# Altium footprint library 二极管-整流桥.PcbLib: 42 footprints (part 2 of 3)
Each footprint in its own frame and in the unit in brackets; x right, y up, seen from the top. Pads: shape width x height; smd on the part's side, far side on the other; paste and mask are expansions set on the pad; w line width, h text height; cw(c..) or ccw(c..) is an arc to the next point about the centre after c.
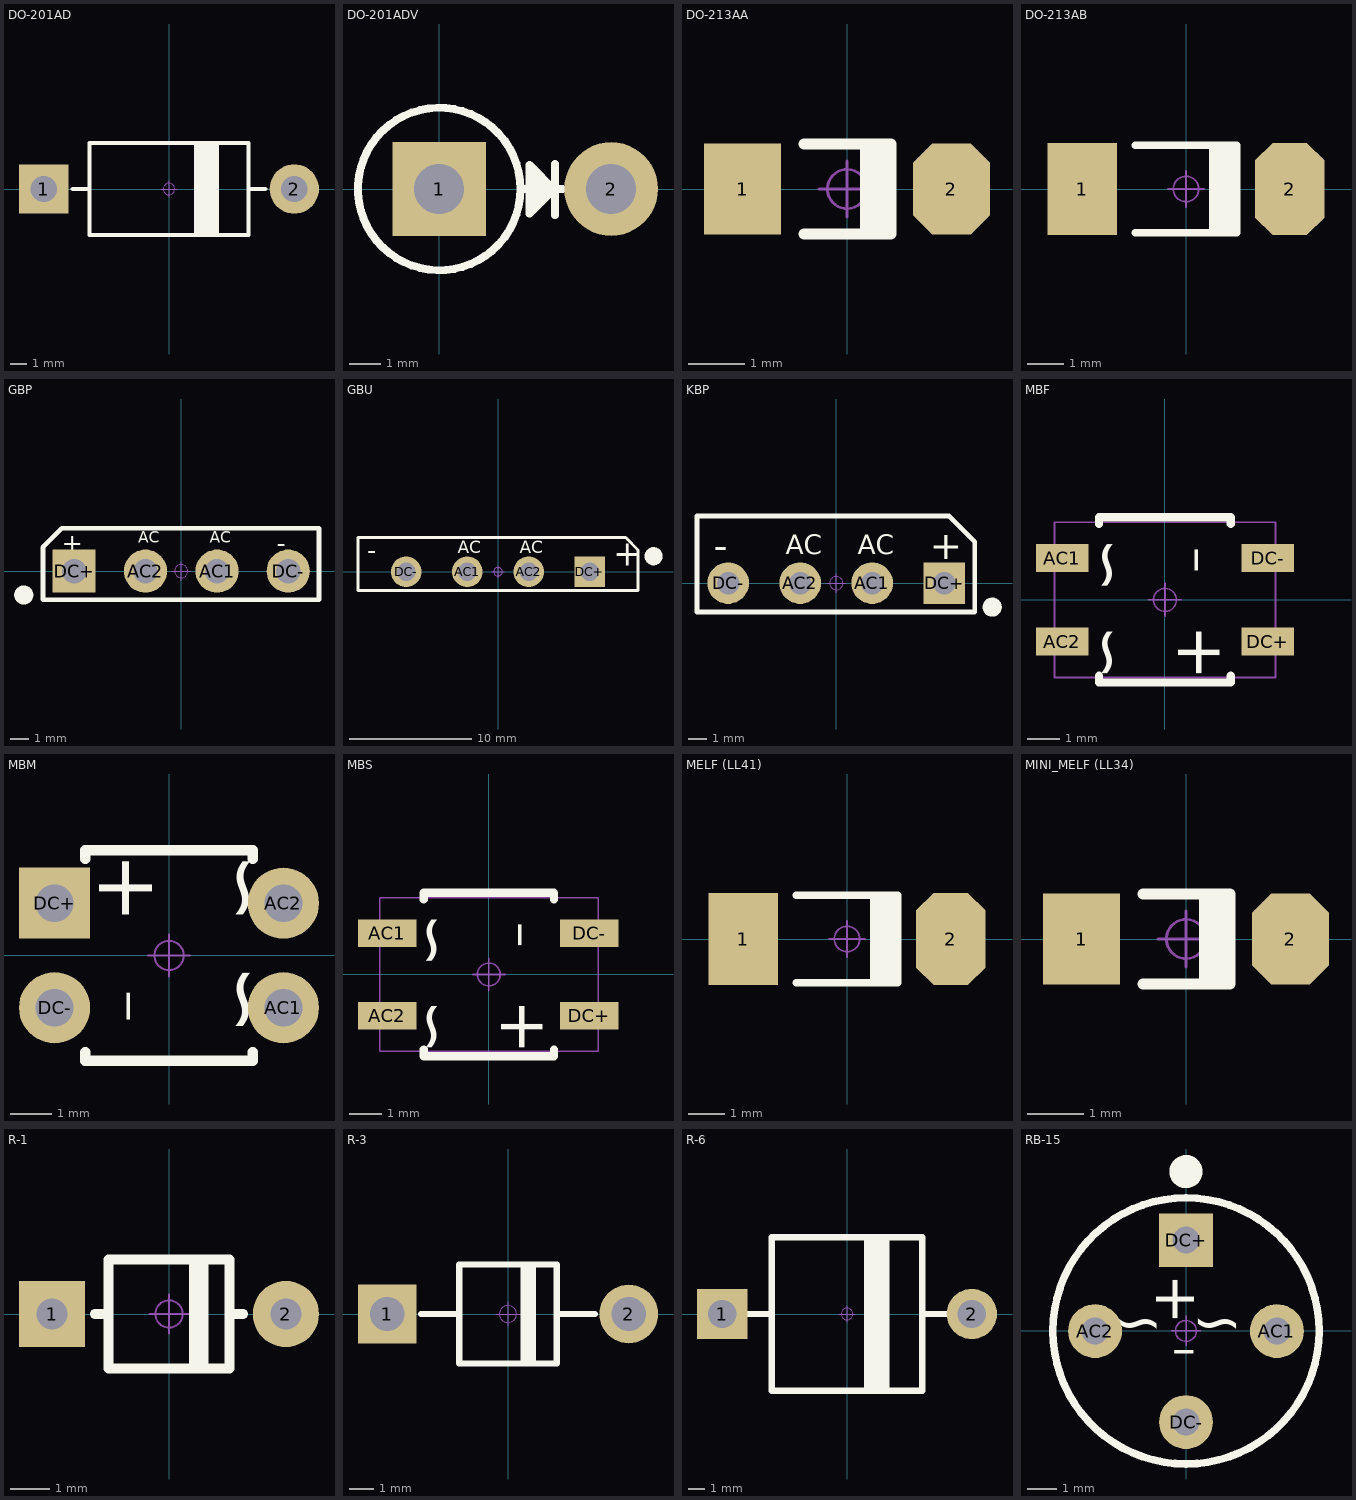
[diagram p1: the footprints below, top view; thin cyan lines are the x and y axes]

## DO-201AD [mm] "5.2*15.2mm(直径，脚距）"
pads (2):
  rect 3x3 hole 1.6: 1(-7.6,0)
  round 3 hole 1.6: 2(7.6,0)
Top Overlay:
  rectangle: 1.524,-2.794 3.048,2.794
  lines w0.254: -5.842,0 -4.826,0 ; 4.826,0 5.842,0 ; -4.826,-2.794 4.826,-2.794 4.826,2.794 -4.826,2.794 -4.826,-2.794
Mechanical 15:
  circle w0.05: c0,0 r0.35
  lines w0.05: -0.5,0 0.5,0 ; 0,-0.5 0,0.5
3D body: height 5.25, standoff -3.46, extent -8.25,-2.601 8.25,2.601

## DO-201ADV [mm] "5.2*5.5mm(直径，脚距）"
pads (2):
  rect 3x3 hole 1.6: 1(0,0)
  round 3 hole 1.6: 2(5.5,0)
Top Overlay:
  circle w0.254: c0,0 r2.6
  lines w0.254: 2.616,0 3.698,0 ; 3.048,0.559 3.073,-0.432 3.556,0 ; 3.302,-0.254 3.302,0 3.302,0.254 3.556,0 ; 3.658,-0.02 2.885,-0.792 2.885,0.775 3.698,-0.038 ; 3.698,-0.841 3.698,0.805 ; 3.937,0 3.556,0
3D body: height 12, standoff -3.46, extent -2.601,-2.601 6.15,2.601

## DO-213AA [mm] "1.5*3.5mm(直径，脚距）"
pads (2):
  rect 1.37x1.62 smd: 1(-1.855,0)
  oct 1.37x1.62 smd: 2(1.855,0)
Top Overlay:
  rectangle: 0.227,-0.8 0.777,0.8
  lines w0.2: -0.762,-0.8 0.777,-0.8 0.777,0.8 -0.762,0.8
Mechanical 15:
  circle w0.05: c0,0 r0.35
  lines w0.05: -0.5,0 0.5,0 ; 0,-0.5 0,0.5
3D body: height 1.53, standoff 0.03, extent -1.75,-0.751 1.75,0.751

## DO-213AB [mm] "2.5*5.6mm(直径，脚距）"
height 2.54
pads (2):
  rect 1.9x2.54 smd: 1(-2.85,0)
  oct 1.9x2.54 smd: 2(2.85,0)
Top Overlay:
  rectangle: 0.85,-1.2 1.4,1.2
  rectangle: 0.635,-1.2 0.85,1.2
  lines w0.2: -1.4,-1.2 1.4,-1.2 1.4,1.2 -1.4,1.2
Mechanical 15:
  circle w0.05: c0,0 r0.35
  lines w0.05: -0.5,0 0.5,0 ; 0,-0.5 0,0.5
3D body: height 2.55, standoff 0.05, extent -2.53,-1.251 2.53,1.251

## GBP [mm] "14.2*2.9*10.5mm(长宽高)"
pads (4):
  round 2.3 hole 1.3: AC1(1.91,0) AC2(-1.9,0) DC-(5.7,0)
  rect 2.3x2.3 hole 1.3: DC+(-5.7,0)
Top Overlay:
  circle w0.508: c-8.382,-1.27 r0.254
  lines w0.254: -7.36,-1.524 -7.36,1.276 -6.35,2.286 7.34,2.286 7.34,-1.524 -7.36,-1.524
  text "AC" at 1.524,1.524 h0.6
  text "+" at -6.35,1.016 h1
  text "-" at 5.08,1.016 h1
  text "AC" at -2.286,1.524 h0.6
Mechanical 15:
  circle w0.05: c0,0 r0.35
  lines w0.05: -0.5,0 0.5,0 ; 0,-0.5 0,0.5
3D body: height 12.8, standoff -3.6, extent -7.1,-1 7.1,1.9

## GBU [mm] "整流桥，脚距：5mm/200mil"
pads (4):
  round 2.5 hole 1.5: AC1(-2.5,0) AC2(2.5,0) DC-(-7.5,0)
  rect 2.5x2.5 hole 1.5: DC+(7.5,0)
Top Overlay:
  circle w0.762: c12.7,1.27 r0.359
  lines w0.254: -11.43,-1.524 -11.43,2.794 -8.422,2.794 10.414,2.794 11.43,1.778 11.43,-1.524 -11.43,-1.524
  text "-" at -10.668,1.016 h1.52
  text "+" at 9.398,0.508 h2.03
  text "AC" at -3.302,1.524 h1.02
  text "AC" at 1.778,1.524 h1.02
Mechanical 15:
  circle w0.05: c0,0 r0.35
  lines w0.05: -0.5,0 0.5,0 ; 0,-0.5 0,0.5
3D body: height 20.8, standoff -4, extent -11,-1.15 11,2.35

## KBP [mm] "14.7*4.8*12.2mm(长宽高)"
pads (4):
  round 2.2 hole 1.2: AC1(1.9,0) AC2(-1.91,0) DC-(-5.72,0)
  rect 2.2x2.2 hole 1.2: DC+(5.71,0)
Top Overlay:
  circle w0.508: c8.25,-1.27 r0.254
  lines w0.254: -7.37,-1.524 -7.37,3.55 5.97,3.55 7.33,2.19 7.33,-1.524 -7.37,-1.524
  text "+" at 4.948,1.27 h1.5
  text "-" at -6.482,1.27 h1.5
  text "AC" at -2.672,1.524 h1.02
  text "AC" at 1.138,1.524 h1.02
Mechanical 15:
  circle w0.05: c0,0 r0.35
  lines w0.05: -0.5,0 0.5,0 ; 0,-0.5 0,0.5
3D body: height 11.7, standoff -3.1, extent -7.35,-1.25 7.35,3.55

## MBF [mm] "4.7*7*1.5mm(长宽高)"
height 12.3
pads (4):
  rect 1.6x0.85 smd: AC1(-3.127,1.27) AC2(-3.127,-1.27) DC+(3.127,-1.27) DC-(3.127,1.27)
Top Overlay:
  lines w0.254: -2.007,-2.311 -2.007,-2.515 2.007,-2.515 2.007,-2.311 ; -2.007,2.311 -2.007,2.515 2.007,2.515 2.007,2.311
  text "~" at -0.635,1.905 h2.54
  text "~" at -0.635,-0.762 h2.54
  text "-" at 2.159,1.651 h3.05
  text "+" at 2.159,-0.762 h2.54
Mechanical 13:
  lines w0.05: -3.363,-2.363 3.363,-2.363 3.363,2.362 -3.363,2.362 -3.363,-2.363
Mechanical 15:
  circle w0.05: c0,0 r0.35
  lines w0.05: -0.5,0 0.5,0 ; 0,-0.5 0,0.5
3D body: height 1.6, standoff -0.03, extent -3.5,-2.35 3.5,2.35

## MBM [mm] "4.8*5.2*2.5mm(长宽高)"
pads (4):
  round 1.7 hole 0.9: AC1(2.737,-1.25) AC2(2.737,1.25) DC-(-2.737,-1.25)
  rect 1.7x1.7 hole 0.9: DC+(-2.737,1.25)
Top Overlay:
  lines w0.254: -2.007,-2.311 -2.007,-2.515 2.007,-2.515 2.007,-2.311 ; -2.007,2.311 -2.007,2.515 2.007,2.515 2.007,2.311
  text "+" at -2.159,0.762 h2.54
  text "-" at -2.159,-1.651 h3.05
  text "~" at 0.635,0.762 h2.54
  text "~" at 0.635,-1.905 h2.54
Mechanical 15:
  circle w0.05: c0,0 r0.35
  lines w0.05: -0.5,0 0.5,0 ; 0,-0.5 0,0.5
3D body: height 2.6, standoff -3.11, extent -3.154,-2.4 3.094,2.4

## MBS [mm] "4.1*6.8*2.5mm(长宽高)"
height 12.3
pads (4):
  rect 1.8x0.85 smd: AC1(-3.127,1.27) AC2(-3.127,-1.27) DC+(3.096,-1.27) DC-(3.096,1.27)
Top Overlay:
  lines w0.254: -2.007,-2.311 -2.007,-2.515 2.007,-2.515 2.007,-2.311 ; -2.007,2.311 -2.007,2.515 2.007,2.515 2.007,2.311
  text "+" at 2.159,-0.762 h2.54
  text "-" at 2.159,1.651 h3.05
  text "~" at -0.635,-0.762 h2.54
  text "~" at -0.635,1.905 h2.54
Mechanical 13:
  lines w0.05: -3.363,-2.363 3.363,-2.363 3.363,2.362 -3.363,2.362 -3.363,-2.363
Mechanical 15:
  circle w0.05: c0,0 r0.35
  lines w0.05: -0.5,0 0.5,0 ; 0,-0.5 0,0.5
3D body: height 2.6, standoff -0.03, extent -3.4,-2.4 3.4,2.4

## MELF (LL41) [mm] "2.4*5.3mm(直径，脚距）"
height 2.54
pads (2):
  rect 1.9x2.54 smd: 1(-2.85,0)
  oct 1.9x2.54 smd: 2(2.85,0)
Top Overlay:
  rectangle: 0.635,-1.2 0.85,1.2
  rectangle: 0.85,-1.2 1.4,1.2
  lines w0.2: -1.4,-1.2 1.4,-1.2 1.4,1.2 -1.4,1.2
Mechanical 15:
  circle w0.05: c0,0 r0.35
  lines w0.05: -0.5,0 0.5,0 ; 0,-0.5 0,0.5
3D body: height 2.4, standoff 0, extent -2.651,-1.2 2.651,1.2

## MINI_MELF (LL34) [mm] "1.5*3.4mm(直径，脚距）"
pads (2):
  rect 1.37x1.62 smd: 1(-1.855,0)
  oct 1.37x1.62 smd: 2(1.855,0)
Top Overlay:
  rectangle: 0.227,-0.8 0.777,0.8
  lines w0.2: -0.762,-0.8 0.777,-0.8 0.777,0.8 -0.762,0.8
Mechanical 15:
  circle w0.05: c0,0 r0.35
  lines w0.05: -0.5,0 0.5,0 ; 0,-0.5 0,0.5
3D body: height 1.5, standoff 0, extent -1.701,-0.75 1.701,0.75

## R-1 [mm] "2.5*6mm(直径，脚距）"
pads (2):
  rect 1.7x1.7 hole 0.8: 1(-3,0)
  round 1.7 hole 0.8: 2(3,0)
Top Overlay:
  rectangle: 0.508,-1.397 1.016,1.397
  lines w0.254: -1.905,0 -1.55,0 ; 1.55,0 1.905,0 ; -1.55,-1.397 1.55,-1.397 1.55,1.397 -1.55,1.397 -1.55,-1.397
Mechanical 15:
  circle w0.05: c0,0 r0.35
  lines w0.05: -0.5,0 0.5,0 ; 0,-0.5 0,0.5
3D body: height 2.55, standoff -3.45, extent -3.3,-1.251 3.3,1.251

## R-3 [mm] "3.9*9.9mm(直径，脚距）"
pads (2):
  rect 2.4x2.4 hole 1.4: 1(-4.95,0)
  round 2.4 hole 1.4: 2(4.95,0)
Top Overlay:
  rectangle: 0.508,-2.032 1.143,2.032
  lines w0.254: -3.556,0 -2,0 ; 2.032,0 3.556,0 ; -2,-2.032 -2,2.032 2,2.032 2,-2.032 -2,-2.032
Mechanical 15:
  circle w0.05: c0,0 r0.35
  lines w0.05: -0.5,0 0.5,0 ; 0,-0.5 0,0.5
3D body: height 3.95, standoff -3.45, extent -5.5,-1.951 5.5,1.951

## R-6 [mm] "8.8*14.9mm(直径，脚距）"
pads (2):
  rect 3x3 hole 1.7: 1(-7.45,0)
  round 3 hole 1.7: 2(7.45,0)
Top Overlay:
  rectangle: 1.016,-4.572 2.54,4.572
  lines w0.381: -6.056,0 -4.5,0 ; 4.5,0 6.024,0 ; -4.5,-4.572 -4.5,4.572 4.5,4.572 4.5,-4.572 -4.5,-4.572
Mechanical 15:
  circle w0.05: c0,0 r0.35
  lines w0.05: -0.5,0 0.5,0 ; 0,-0.5 0,0.5
3D body: height 8.85, standoff -3.45, extent -8.1,-4.401 8.1,4.401

## RB-15 [mm] "8.9*3.5mm(直径，高)"
pads (4):
  round 1.8 hole 0.9: AC1(3.041,-0.007) AC2(-3.041,-0.007) DC-(0,-3.048)
  rect 1.8x1.8 hole 0.9: DC+(0,3.033)
Top Overlay:
  circle w0.254: c0,0 r4.45
  circle w0.6: c0,5.327 r0.254
  text "+" at 0.762,1.905 h2.54
  text "-" at 0.381,-1.905 h3.05
  text "~" at -0.762,-0.889 h2.54
  text "~" at 1.905,-0.889 h2.54
Mechanical 15:
  circle w0.05: c0,0 r0.35
  lines w0.05: -0.5,0 0.5,0 ; 0,-0.5 0,0.5
3D body: height 3.55, standoff -3.45, extent -4.45,-4.45 4.45,4.45